# Altium schematic symbol library jlcpcb_2025_04_inductors_extended_0402.schlib: 1396 symbols (part 4 of 8)
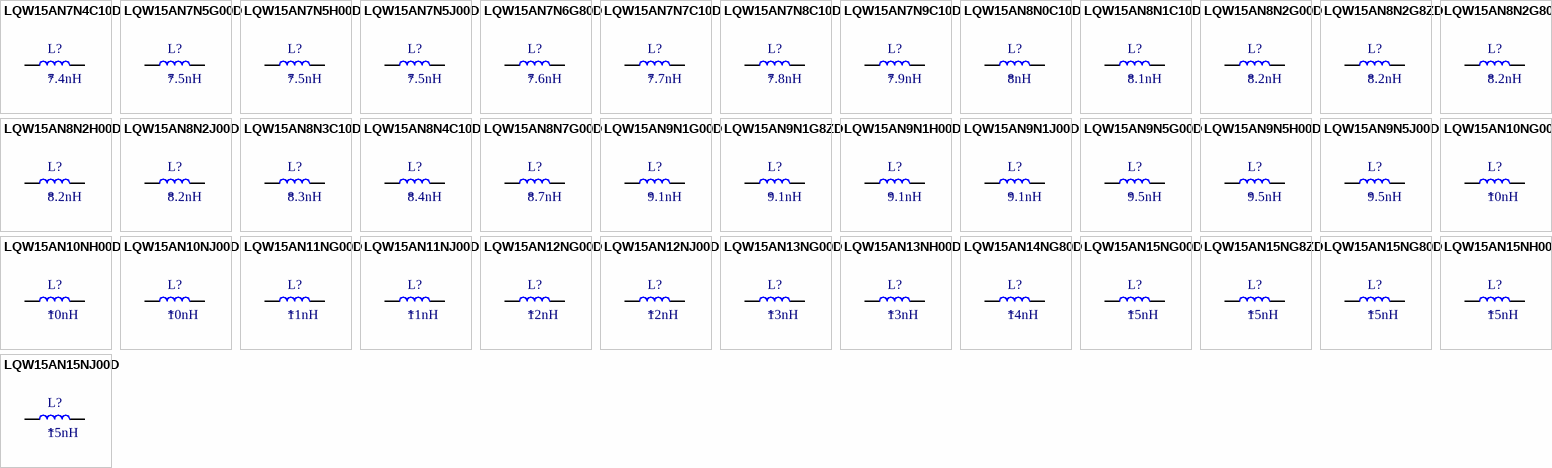
[diagram p37: symbols LQW15AN7N4C10D to LQW15AN15NJ00D]

## LQW15AN7N4C10D
designator L?  Inductance: 7.4nH
Inductor, 7.4nH, 58mΩ, SMD 0402; Manufacturer: Murata Electronics; Manufacturer Part Number: LQW15AN7N4C10D; Self-Resonant Frequency: 6.8GHz; Q Factor: 30@250MHz; Package Size: 0402; JLCPCB Basic Part: No; JLCPCB Part Number: C412356; Supplier 1: LCSC; Category: Inductors; Supplier Part Number 1: C412356; DC Resistance: 58mΩ; RoHS: Yes; ComponentLink1Description: Datasheet; ComponentLink1URL: https://wmsc.lcsc.com/wmsc/upload/file/pdf/v2/lcsc/2304140030_Murata-Electronics-LQW15AN7N4C10D_C412356.pdf; ComponentLink2Description: JLCPCB Part URL; ComponentLink2URL: https://jlcpcb.com/partdetail/C412356; ComponentLink3Description: LCSC Part URL; ComponentLink3URL: https://lcsc.com/product-detail/Inductors-SMD_Murata-Electronics-Murata-Electronics-LQW15AN7N4C10D_C412356.html
footprint IND-0402 (0402 (1005M) Inductor)
pins: 1, 2

## LQW15AN7N5G00D
designator L?  Inductance: 7.5nH
Inductor, 7.5nH, ±2%, 130mΩ, 570mA, SMD 0402; Manufacturer: Murata Electronics; Manufacturer Part Number: LQW15AN7N5G00D; Self-Resonant Frequency: 6GHz; Q Factor: 25@250MHz; Package Size: 0402; JLCPCB Basic Part: No; JLCPCB Part Number: C82918; Supplier 1: LCSC; Category: Inductors; Supplier Part Number 1: C82918; Tolerance: ±2%; Rated Current: 570mA; DC Resistance: 130mΩ; RoHS: Yes; ComponentLink1Description: Datasheet; ComponentLink1URL: https://wmsc.lcsc.com/wmsc/upload/file/pdf/v2/lcsc/1811081612_Murata-Electronics-LQW15AN7N5G00D_C82918.pdf; ComponentLink2Description: JLCPCB Part URL; ComponentLink2URL: https://jlcpcb.com/partdetail/C82918; ComponentLink3Description: LCSC Part URL; ComponentLink3URL: https://lcsc.com/product-detail/Inductors-SMD_Murata-Electronics-Murata-Electronics-LQW15AN7N5G00D_C82918.html
footprint IND-0402 (0402 (1005M) Inductor)
pins: 1, 2

## LQW15AN7N5H00D
designator L?  Inductance: 7.5nH
Inductor, 7.5nH, ±3%, 130mΩ, 570mA, SMD 0402; Manufacturer: Murata Electronics; Manufacturer Part Number: LQW15AN7N5H00D; Self-Resonant Frequency: 6GHz; Q Factor: 25@250MHz; Package Size: 0402; JLCPCB Basic Part: No; JLCPCB Part Number: C397303; Supplier 1: LCSC; Category: Inductors; Supplier Part Number 1: C397303; Tolerance: ±3%; Rated Current: 570mA; DC Resistance: 130mΩ; RoHS: Yes; ComponentLink1Description: Datasheet; ComponentLink1URL: https://wmsc.lcsc.com/wmsc/upload/file/pdf/v2/lcsc/2304140030_Murata-Electronics-LQW15AN7N5H00D_C397303.pdf; ComponentLink2Description: JLCPCB Part URL; ComponentLink2URL: https://jlcpcb.com/partdetail/C397303; ComponentLink3Description: LCSC Part URL; ComponentLink3URL: https://lcsc.com/product-detail/Inductors-SMD_Murata-Electronics-Murata-Electronics-LQW15AN7N5H00D_C397303.html
footprint IND-0402 (0402 (1005M) Inductor)
pins: 1, 2

## LQW15AN7N5J00D
designator L?  Inductance: 7.5nH
Inductor, 7.5nH, ±5%, 130mΩ, 570mA, SMD 0402; Manufacturer: Murata Electronics; Manufacturer Part Number: LQW15AN7N5J00D; Self-Resonant Frequency: 6GHz; Q Factor: 25@250MHz; Package Size: 0402; JLCPCB Basic Part: No; JLCPCB Part Number: C113120; Supplier 1: LCSC; Category: Inductors; Supplier Part Number 1: C113120; Tolerance: ±5%; Rated Current: 570mA; DC Resistance: 130mΩ; RoHS: Yes; ComponentLink1Description: Datasheet; ComponentLink1URL: https://wmsc.lcsc.com/wmsc/upload/file/pdf/v2/lcsc/2304140030_Murata-Electronics-LQW15AN7N5J00D_C113120.pdf; ComponentLink2Description: JLCPCB Part URL; ComponentLink2URL: https://jlcpcb.com/partdetail/C113120; ComponentLink3Description: LCSC Part URL; ComponentLink3URL: https://lcsc.com/product-detail/Inductors-SMD_Murata-Electronics-Murata-Electronics-LQW15AN7N5J00D_C113120.html
footprint IND-0402 (0402 (1005M) Inductor)
pins: 1, 2

## LQW15AN7N6G80D
designator L?  Inductance: 7.6nH
Inductor, 7.6nH, ±2%, 50mΩ, 1.7A, SMD 0402; Manufacturer: Murata Electronics; Manufacturer Part Number: LQW15AN7N6G80D; Package Size: 0402; JLCPCB Basic Part: No; JLCPCB Part Number: C2048575; Supplier 1: LCSC; Category: Inductors; Supplier Part Number 1: C2048575; Tolerance: ±2%; Rated Current: 1.7A; DC Resistance: 50mΩ; RoHS: Yes; ComponentLink1Description: Datasheet; ComponentLink1URL: https://wmsc.lcsc.com/wmsc/upload/file/pdf/v2/lcsc/2304140030_Murata-Electronics-LQW15AN7N6G80D_C2048575.pdf; ComponentLink2Description: JLCPCB Part URL; ComponentLink2URL: https://jlcpcb.com/partdetail/C2048575; ComponentLink3Description: LCSC Part URL; ComponentLink3URL: https://lcsc.com/product-detail/Power-Inductors_Murata-Electronics-Murata-Electronics-LQW15AN7N6G80D_C2048575.html
footprint IND-0402 (0402 (1005M) Inductor)
pins: 1, 2

## LQW15AN7N7C10D
designator L?  Inductance: 7.7nH
Inductor, 7.7nH, 58mΩ, SMD 0402; Manufacturer: Murata Electronics; Manufacturer Part Number: LQW15AN7N7C10D; Self-Resonant Frequency: 6.8GHz; Q Factor: 30@250MHz; Package Size: 0402; JLCPCB Basic Part: No; JLCPCB Part Number: C412358; Supplier 1: LCSC; Category: Inductors; Supplier Part Number 1: C412358; DC Resistance: 58mΩ; RoHS: Yes; ComponentLink1Description: Datasheet; ComponentLink1URL: https://wmsc.lcsc.com/wmsc/upload/file/pdf/v2/lcsc/2304140030_Murata-Electronics-LQW15AN7N7C10D_C412358.pdf; ComponentLink2Description: JLCPCB Part URL; ComponentLink2URL: https://jlcpcb.com/partdetail/C412358; ComponentLink3Description: LCSC Part URL; ComponentLink3URL: https://lcsc.com/product-detail/Inductors-SMD_Murata-Electronics-Murata-Electronics-LQW15AN7N7C10D_C412358.html
footprint IND-0402 (0402 (1005M) Inductor)
pins: 1, 2

## LQW15AN7N8C10D
designator L?  Inductance: 7.8nH
Inductor, 7.8nH, 58mΩ, SMD 0402; Manufacturer: Murata Electronics; Manufacturer Part Number: LQW15AN7N8C10D; Self-Resonant Frequency: 6.8GHz; Q Factor: 30@250MHz; Package Size: 0402; JLCPCB Basic Part: No; JLCPCB Part Number: C412359; Supplier 1: LCSC; Category: Inductors; Supplier Part Number 1: C412359; DC Resistance: 58mΩ; RoHS: Yes; ComponentLink1Description: Datasheet; ComponentLink1URL: https://wmsc.lcsc.com/wmsc/upload/file/pdf/v2/lcsc/2304140030_Murata-Electronics-LQW15AN7N8C10D_C412359.pdf; ComponentLink2Description: JLCPCB Part URL; ComponentLink2URL: https://jlcpcb.com/partdetail/C412359; ComponentLink3Description: LCSC Part URL; ComponentLink3URL: https://lcsc.com/product-detail/Inductors-SMD_Murata-Electronics-Murata-Electronics-LQW15AN7N8C10D_C412359.html
footprint IND-0402 (0402 (1005M) Inductor)
pins: 1, 2

## LQW15AN7N9C10D
designator L?  Inductance: 7.9nH
Inductor, 7.9nH, 79mΩ, SMD 0402; Manufacturer: Murata Electronics; Manufacturer Part Number: LQW15AN7N9C10D; Self-Resonant Frequency: 7.5GHz; Q Factor: 30@250MHz; Package Size: 0402; JLCPCB Basic Part: No; JLCPCB Part Number: C412360; Supplier 1: LCSC; Category: Inductors; Supplier Part Number 1: C412360; DC Resistance: 79mΩ; RoHS: Yes; ComponentLink1Description: Datasheet; ComponentLink1URL: https://wmsc.lcsc.com/wmsc/upload/file/pdf/v2/lcsc/2304140030_Murata-Electronics-LQW15AN7N9C10D_C412360.pdf; ComponentLink2Description: JLCPCB Part URL; ComponentLink2URL: https://jlcpcb.com/partdetail/C412360; ComponentLink3Description: LCSC Part URL; ComponentLink3URL: https://lcsc.com/product-detail/Inductors-SMD_Murata-Electronics-Murata-Electronics-LQW15AN7N9C10D_C412360.html
footprint IND-0402 (0402 (1005M) Inductor)
pins: 1, 2

## LQW15AN8N0C10D
designator L?  Inductance: 8nH
Inductor, 8nH, 79mΩ, SMD 0402; Manufacturer: Murata Electronics; Manufacturer Part Number: LQW15AN8N0C10D; Self-Resonant Frequency: 7.5GHz; Q Factor: 30@250MHz; Package Size: 0402; JLCPCB Basic Part: No; JLCPCB Part Number: C412361; Supplier 1: LCSC; Category: Inductors; Supplier Part Number 1: C412361; DC Resistance: 79mΩ; RoHS: Yes; ComponentLink1Description: Datasheet; ComponentLink1URL: https://wmsc.lcsc.com/wmsc/upload/file/pdf/v2/lcsc/2304140030_Murata-Electronics-LQW15AN8N0C10D_C412361.pdf; ComponentLink2Description: JLCPCB Part URL; ComponentLink2URL: https://jlcpcb.com/partdetail/C412361; ComponentLink3Description: LCSC Part URL; ComponentLink3URL: https://lcsc.com/product-detail/Inductors-SMD_Murata-Electronics-Murata-Electronics-LQW15AN8N0C10D_C412361.html
footprint IND-0402 (0402 (1005M) Inductor)
pins: 1, 2

## LQW15AN8N1C10D
designator L?  Inductance: 8.1nH
Inductor, 8.1nH, 79mΩ, SMD 0402; Manufacturer: Murata Electronics; Manufacturer Part Number: LQW15AN8N1C10D; Self-Resonant Frequency: 7.5GHz; Q Factor: 30@250MHz; Package Size: 0402; JLCPCB Basic Part: No; JLCPCB Part Number: C412362; Supplier 1: LCSC; Category: Inductors; Supplier Part Number 1: C412362; DC Resistance: 79mΩ; RoHS: Yes; ComponentLink1Description: Datasheet; ComponentLink1URL: https://wmsc.lcsc.com/wmsc/upload/file/pdf/v2/lcsc/2304140030_Murata-Electronics-LQW15AN8N1C10D_C412362.pdf; ComponentLink2Description: JLCPCB Part URL; ComponentLink2URL: https://jlcpcb.com/partdetail/C412362; ComponentLink3Description: LCSC Part URL; ComponentLink3URL: https://lcsc.com/product-detail/Inductors-SMD_Murata-Electronics-Murata-Electronics-LQW15AN8N1C10D_C412362.html
footprint IND-0402 (0402 (1005M) Inductor)
pins: 1, 2

## LQW15AN8N2G00D
designator L?  Inductance: 8.2nH
Inductor, 8.2nH, ±2%, 140mΩ, SMD 0402; Manufacturer: Murata Electronics; Manufacturer Part Number: LQW15AN8N2G00D; Self-Resonant Frequency: 5.5GHz; Q Factor: 25@250MHz; Package Size: 0402; JLCPCB Basic Part: No; JLCPCB Part Number: C84404; Supplier 1: LCSC; Category: Inductors; Supplier Part Number 1: C84404; Tolerance: ±2%; DC Resistance: 140mΩ; RoHS: Yes; ComponentLink1Description: Datasheet; ComponentLink1URL: https://wmsc.lcsc.com/wmsc/upload/file/pdf/v2/lcsc/1811081516_Murata-Electronics-LQW15AN8N2G00D_C84404.pdf; ComponentLink2Description: JLCPCB Part URL; ComponentLink2URL: https://jlcpcb.com/partdetail/C84404; ComponentLink3Description: LCSC Part URL; ComponentLink3URL: https://lcsc.com/product-detail/Inductors-SMD_Murata-Electronics-Murata-Electronics-LQW15AN8N2G00D_C84404.html
footprint IND-0402 (0402 (1005M) Inductor)
pins: 1, 2

## LQW15AN8N2G8ZD
designator L?  Inductance: 8.2nH
Inductor, 8.2nH, ±2%, 69mΩ, 1.5A, SMD 0402; Manufacturer: Murata Electronics; Manufacturer Part Number: LQW15AN8N2G8ZD; Self-Resonant Frequency: 6.5GHz; Q Factor: 32@250MHz; Package Size: 0402; JLCPCB Basic Part: No; JLCPCB Part Number: C1330582; Supplier 1: LCSC; Category: Inductors; Supplier Part Number 1: C1330582; Tolerance: ±2%; Rated Current: 1.5A; DC Resistance: 69mΩ; RoHS: Yes; ComponentLink1Description: Datasheet; ComponentLink1URL: https://wmsc.lcsc.com/wmsc/upload/file/pdf/v2/lcsc/2304140030_Murata-Electronics-LQW15AN8N2G8ZD_C1330582.pdf; ComponentLink2Description: JLCPCB Part URL; ComponentLink2URL: https://jlcpcb.com/partdetail/C1330582; ComponentLink3Description: LCSC Part URL; ComponentLink3URL: https://lcsc.com/product-detail/Inductors-SMD_Murata-Electronics-Murata-Electronics-LQW15AN8N2G8ZD_C1330582.html
footprint IND-0402 (0402 (1005M) Inductor)
pins: 1, 2

## LQW15AN8N2G80D
designator L?  Inductance: 8.2nH
Inductor, 8.2nH, ±2%, 69mΩ, 1.5A, SMD 0402; Manufacturer: Murata Electronics; Manufacturer Part Number: LQW15AN8N2G80D; Self-Resonant Frequency: 6.5GHz; Q Factor: 32@250MHz; Package Size: 0402; JLCPCB Basic Part: No; JLCPCB Part Number: C307610; Supplier 1: LCSC; Category: Inductors; Supplier Part Number 1: C307610; Tolerance: ±2%; Rated Current: 1.5A; DC Resistance: 69mΩ; RoHS: Yes; ComponentLink1Description: Datasheet; ComponentLink1URL: https://wmsc.lcsc.com/wmsc/upload/file/pdf/v2/lcsc/2304140030_Murata-Electronics-LQW15AN8N2G80D_C307610.pdf; ComponentLink2Description: JLCPCB Part URL; ComponentLink2URL: https://jlcpcb.com/partdetail/C307610; ComponentLink3Description: LCSC Part URL; ComponentLink3URL: https://lcsc.com/product-detail/Inductors-SMD_Murata-Electronics-Murata-Electronics-LQW15AN8N2G80D_C307610.html
footprint IND-0402 (0402 (1005M) Inductor)
pins: 1, 2

## LQW15AN8N2H00D
designator L?  Inductance: 8.2nH
Inductor, 8.2nH, ±3%, 140mΩ, 540mA, SMD 0402; Manufacturer: Murata Electronics; Manufacturer Part Number: LQW15AN8N2H00D; Self-Resonant Frequency: 5.5GHz; Q Factor: 25@250MHz; Package Size: 0402; JLCPCB Basic Part: No; JLCPCB Part Number: C341788; Supplier 1: LCSC; Category: Inductors; Supplier Part Number 1: C341788; Tolerance: ±3%; Rated Current: 540mA; DC Resistance: 140mΩ; RoHS: Yes; ComponentLink1Description: Datasheet; ComponentLink1URL: https://wmsc.lcsc.com/wmsc/upload/file/pdf/v2/lcsc/2304140030_Murata-Electronics-LQW15AN8N2H00D_C341788.pdf; ComponentLink2Description: JLCPCB Part URL; ComponentLink2URL: https://jlcpcb.com/partdetail/C341788; ComponentLink3Description: LCSC Part URL; ComponentLink3URL: https://lcsc.com/product-detail/Inductors-SMD_Murata-Electronics-Murata-Electronics-LQW15AN8N2H00D_C341788.html
footprint IND-0402 (0402 (1005M) Inductor)
pins: 1, 2

## LQW15AN8N2J00D
designator L?  Inductance: 8.2nH
Inductor, 8.2nH, ±5%, 140mΩ, 540mA, SMD 0402; Manufacturer: Murata Electronics; Manufacturer Part Number: LQW15AN8N2J00D; Self-Resonant Frequency: 5.5GHz; Q Factor: 25@250MHz; Package Size: 0402; JLCPCB Basic Part: No; JLCPCB Part Number: C98066; Supplier 1: LCSC; Category: Inductors; Supplier Part Number 1: C98066; Tolerance: ±5%; Rated Current: 540mA; DC Resistance: 140mΩ; RoHS: Yes; ComponentLink1Description: Datasheet; ComponentLink1URL: https://wmsc.lcsc.com/wmsc/upload/file/pdf/v2/lcsc/2304140030_Murata-Electronics-LQW15AN8N2J00D_C98066.pdf; ComponentLink2Description: JLCPCB Part URL; ComponentLink2URL: https://jlcpcb.com/partdetail/C98066; ComponentLink3Description: LCSC Part URL; ComponentLink3URL: https://lcsc.com/product-detail/Inductors-SMD_Murata-Electronics-Murata-Electronics-LQW15AN8N2J00D_C98066.html
footprint IND-0402 (0402 (1005M) Inductor)
pins: 1, 2

## LQW15AN8N3C10D
designator L?  Inductance: 8.3nH
Inductor, 8.3nH, 79mΩ, SMD 0402; Manufacturer: Murata Electronics; Manufacturer Part Number: LQW15AN8N3C10D; Self-Resonant Frequency: 7.5GHz; Q Factor: 30@250MHz; Package Size: 0402; JLCPCB Basic Part: No; JLCPCB Part Number: C412363; Supplier 1: LCSC; Category: Inductors; Supplier Part Number 1: C412363; DC Resistance: 79mΩ; RoHS: Yes; ComponentLink1Description: Datasheet; ComponentLink1URL: https://wmsc.lcsc.com/wmsc/upload/file/pdf/v2/lcsc/2304140030_Murata-Electronics-LQW15AN8N3C10D_C412363.pdf; ComponentLink2Description: JLCPCB Part URL; ComponentLink2URL: https://jlcpcb.com/partdetail/C412363; ComponentLink3Description: LCSC Part URL; ComponentLink3URL: https://lcsc.com/product-detail/Inductors-SMD_Murata-Electronics-Murata-Electronics-LQW15AN8N3C10D_C412363.html
footprint IND-0402 (0402 (1005M) Inductor)
pins: 1, 2

## LQW15AN8N4C10D
designator L?  Inductance: 8.4nH
Inductor, 8.4nH, 79mΩ, SMD 0402; Manufacturer: Murata Electronics; Manufacturer Part Number: LQW15AN8N4C10D; Self-Resonant Frequency: 7.5GHz; Q Factor: 30@250MHz; Package Size: 0402; JLCPCB Basic Part: No; JLCPCB Part Number: C412364; Supplier 1: LCSC; Category: Inductors; Supplier Part Number 1: C412364; DC Resistance: 79mΩ; RoHS: Yes; ComponentLink1Description: Datasheet; ComponentLink1URL: https://wmsc.lcsc.com/wmsc/upload/file/pdf/v2/lcsc/1912111437_Murata-Electronics-LQW15AN8N4C10D_C412364.pdf; ComponentLink2Description: JLCPCB Part URL; ComponentLink2URL: https://jlcpcb.com/partdetail/C412364; ComponentLink3Description: LCSC Part URL; ComponentLink3URL: https://lcsc.com/product-detail/Inductors-SMD_Murata-Electronics-Murata-Electronics-LQW15AN8N4C10D_C412364.html
footprint IND-0402 (0402 (1005M) Inductor)
pins: 1, 2

## LQW15AN8N7G00D
designator L?  Inductance: 8.7nH
Inductor, 8.7nH, ±2%, 140mΩ, 540mA, SMD 0402; Manufacturer: Murata Electronics; Manufacturer Part Number: LQW15AN8N7G00D; Self-Resonant Frequency: 5.5GHz; Q Factor: 25@250MHz; Package Size: 0402; JLCPCB Basic Part: No; JLCPCB Part Number: C269828; Supplier 1: LCSC; Category: Inductors; Supplier Part Number 1: C269828; Tolerance: ±2%; Rated Current: 540mA; DC Resistance: 140mΩ; RoHS: Yes; ComponentLink1Description: Datasheet; ComponentLink1URL: https://wmsc.lcsc.com/wmsc/upload/file/pdf/v2/lcsc/2304140030_Murata-Electronics-LQW15AN8N7G00D_C269828.pdf; ComponentLink2Description: JLCPCB Part URL; ComponentLink2URL: https://jlcpcb.com/partdetail/C269828; ComponentLink3Description: LCSC Part URL; ComponentLink3URL: https://lcsc.com/product-detail/Inductors-SMD_Murata-Electronics-Murata-Electronics-LQW15AN8N7G00D_C269828.html
footprint IND-0402 (0402 (1005M) Inductor)
pins: 1, 2

## LQW15AN9N1G00D
designator L?  Inductance: 9.1nH
Inductor, 9.1nH, ±2%, 140mΩ, 540mA, SMD 0402; Manufacturer: Murata Electronics; Manufacturer Part Number: LQW15AN9N1G00D; Self-Resonant Frequency: 5.5GHz; Q Factor: 25@250MHz; Package Size: 0402; JLCPCB Basic Part: No; JLCPCB Part Number: C113122; Supplier 1: LCSC; Category: Inductors; Supplier Part Number 1: C113122; Tolerance: ±2%; Rated Current: 540mA; DC Resistance: 140mΩ; RoHS: Yes; ComponentLink1Description: Datasheet; ComponentLink1URL: https://wmsc.lcsc.com/wmsc/upload/file/pdf/v2/lcsc/2304140030_Murata-Electronics-LQW15AN9N1G00D_C113122.pdf; ComponentLink2Description: JLCPCB Part URL; ComponentLink2URL: https://jlcpcb.com/partdetail/C113122; ComponentLink3Description: LCSC Part URL; ComponentLink3URL: https://lcsc.com/product-detail/Inductors-SMD_Murata-Electronics-Murata-Electronics-LQW15AN9N1G00D_C113122.html
footprint IND-0402 (0402 (1005M) Inductor)
pins: 1, 2

## LQW15AN9N1G8ZD
designator L?  Inductance: 9.1nH
Inductor, 9.1nH, ±2%, 80mΩ, 1.4A, SMD 0402; Manufacturer: Murata Electronics; Manufacturer Part Number: LQW15AN9N1G8ZD; Self-Resonant Frequency: 6.5GHz; Q Factor: 32@250MHz; Package Size: 0402; JLCPCB Basic Part: No; JLCPCB Part Number: C1330593; Supplier 1: LCSC; Category: Inductors; Supplier Part Number 1: C1330593; Tolerance: ±2%; Rated Current: 1.4A; DC Resistance: 80mΩ; RoHS: Yes; ComponentLink1Description: Datasheet; ComponentLink1URL: https://wmsc.lcsc.com/wmsc/upload/file/pdf/v2/lcsc/2304140030_Murata-Electronics-LQW15AN9N1G8ZD_C1330593.pdf; ComponentLink2Description: JLCPCB Part URL; ComponentLink2URL: https://jlcpcb.com/partdetail/C1330593; ComponentLink3Description: LCSC Part URL; ComponentLink3URL: https://lcsc.com/product-detail/Inductors-SMD_Murata-Electronics-Murata-Electronics-LQW15AN9N1G8ZD_C1330593.html
footprint IND-0402 (0402 (1005M) Inductor)
pins: 1, 2

## LQW15AN9N1H00D
designator L?  Inductance: 9.1nH
Inductor, 9.1nH, ±3%, 140mΩ, 540mA, SMD 0402; Manufacturer: Murata Electronics; Manufacturer Part Number: LQW15AN9N1H00D; Package Size: 0402; JLCPCB Basic Part: No; JLCPCB Part Number: C337956; Supplier 1: LCSC; Category: Inductors; Supplier Part Number 1: C337956; Tolerance: ±3%; Rated Current: 540mA; DC Resistance: 140mΩ; RoHS: Yes; ComponentLink1Description: Datasheet; ComponentLink1URL: https://wmsc.lcsc.com/wmsc/upload/file/pdf/v2/lcsc/2304140030_Murata-Electronics-LQW15AN9N1H00D_C337956.pdf; ComponentLink2Description: JLCPCB Part URL; ComponentLink2URL: https://jlcpcb.com/partdetail/C337956; ComponentLink3Description: LCSC Part URL; ComponentLink3URL: https://lcsc.com/product-detail/Power-Inductors_Murata-Electronics-Murata-Electronics-LQW15AN9N1H00D_C337956.html
footprint IND-0402 (0402 (1005M) Inductor)
pins: 1, 2

## LQW15AN9N1J00D
designator L?  Inductance: 9.1nH
Inductor, 9.1nH, ±5%, 140mΩ, 540mA, SMD 0402; Manufacturer: Murata Electronics; Manufacturer Part Number: LQW15AN9N1J00D; Package Size: 0402; JLCPCB Basic Part: No; JLCPCB Part Number: C437364; Supplier 1: LCSC; Category: Inductors; Supplier Part Number 1: C437364; Tolerance: ±5%; Rated Current: 540mA; DC Resistance: 140mΩ; RoHS: Yes; ComponentLink1Description: Datasheet; ComponentLink1URL: https://wmsc.lcsc.com/wmsc/upload/file/pdf/v2/lcsc/2001071133_Murata-Electronics-LQW15AN9N1J00D_C437364.pdf; ComponentLink2Description: JLCPCB Part URL; ComponentLink2URL: https://jlcpcb.com/partdetail/C437364; ComponentLink3Description: LCSC Part URL; ComponentLink3URL: https://lcsc.com/product-detail/Power-Inductors_Murata-Electronics-Murata-Electronics-LQW15AN9N1J00D_C437364.html
footprint IND-0402 (0402 (1005M) Inductor)
pins: 1, 2

## LQW15AN9N5G00D
designator L?  Inductance: 9.5nH
Inductor, 9.5nH, ±2%, 140mΩ, 540mA, SMD 0402; Manufacturer: Murata Electronics; Manufacturer Part Number: LQW15AN9N5G00D; Self-Resonant Frequency: 5.5GHz; Q Factor: 25@250MHz; Package Size: 0402; JLCPCB Basic Part: No; JLCPCB Part Number: C167489; Supplier 1: LCSC; Category: Inductors; Supplier Part Number 1: C167489; Tolerance: ±2%; Rated Current: 540mA; DC Resistance: 140mΩ; RoHS: Yes; ComponentLink1Description: Datasheet; ComponentLink1URL: https://wmsc.lcsc.com/wmsc/upload/file/pdf/v2/lcsc/2304140030_Murata-Electronics-LQW15AN9N5G00D_C167489.pdf; ComponentLink2Description: JLCPCB Part URL; ComponentLink2URL: https://jlcpcb.com/partdetail/C167489; ComponentLink3Description: LCSC Part URL; ComponentLink3URL: https://lcsc.com/product-detail/Inductors-SMD_Murata-Electronics-Murata-Electronics-LQW15AN9N5G00D_C167489.html
footprint IND-0402 (0402 (1005M) Inductor)
pins: 1, 2

## LQW15AN9N5H00D
designator L?  Inductance: 9.5nH
Inductor, 9.5nH, ±3%, 140mΩ, SMD 0402; Manufacturer: Murata Electronics; Manufacturer Part Number: LQW15AN9N5H00D; Self-Resonant Frequency: 5.5GHz; Q Factor: 25@250MHz; Package Size: 0402; JLCPCB Basic Part: No; JLCPCB Part Number: C167490; Supplier 1: LCSC; Category: Inductors; Supplier Part Number 1: C167490; Tolerance: ±3%; DC Resistance: 140mΩ; RoHS: Yes; ComponentLink1Description: Datasheet; ComponentLink1URL: https://wmsc.lcsc.com/wmsc/upload/file/pdf/v2/lcsc/2304140030_Murata-Electronics-LQW15AN9N5H00D_C167490.pdf; ComponentLink2Description: JLCPCB Part URL; ComponentLink2URL: https://jlcpcb.com/partdetail/C167490; ComponentLink3Description: LCSC Part URL; ComponentLink3URL: https://lcsc.com/product-detail/Inductors-SMD_Murata-Electronics-Murata-Electronics-LQW15AN9N5H00D_C167490.html
footprint IND-0402 (0402 (1005M) Inductor)
pins: 1, 2

## LQW15AN9N5J00D
designator L?  Inductance: 9.5nH
Inductor, 9.5nH, ±5%, 140mΩ, SMD 0402; Manufacturer: Murata Electronics; Manufacturer Part Number: LQW15AN9N5J00D; Self-Resonant Frequency: 5.5GHz; Q Factor: 25@250MHz; Package Size: 0402; JLCPCB Basic Part: No; JLCPCB Part Number: C435420; Supplier 1: LCSC; Category: Inductors; Supplier Part Number 1: C435420; Tolerance: ±5%; DC Resistance: 140mΩ; RoHS: Yes; ComponentLink1Description: Datasheet; ComponentLink1URL: https://wmsc.lcsc.com/wmsc/upload/file/pdf/v2/lcsc/2304140030_Murata-Electronics-LQW15AN9N5J00D_C435420.pdf; ComponentLink2Description: JLCPCB Part URL; ComponentLink2URL: https://jlcpcb.com/partdetail/C435420; ComponentLink3Description: LCSC Part URL; ComponentLink3URL: https://lcsc.com/product-detail/Inductors-SMD_Murata-Electronics-Murata-Electronics-LQW15AN9N5J00D_C435420.html
footprint IND-0402 (0402 (1005M) Inductor)
pins: 1, 2

## LQW15AN10NG00D
designator L?  Inductance: 10nH
Inductor, 10nH, ±2%, 170mΩ, 500mA, SMD 0402; Manufacturer: Murata Electronics; Manufacturer Part Number: LQW15AN10NG00D; Self-Resonant Frequency: 100MHz; Q Factor: 25@250MHz; Package Size: 0402; JLCPCB Basic Part: No; JLCPCB Part Number: C90642; Supplier 1: LCSC; Category: Inductors; Supplier Part Number 1: C90642; Tolerance: ±2%; Rated Current: 500mA; DC Resistance: 170mΩ; RoHS: Yes; ComponentLink1Description: Datasheet; ComponentLink1URL: https://wmsc.lcsc.com/wmsc/upload/file/pdf/v2/lcsc/1811081616_Murata-Electronics-LQW15AN10NG00D_C90642.pdf; ComponentLink2Description: JLCPCB Part URL; ComponentLink2URL: https://jlcpcb.com/partdetail/C90642; ComponentLink3Description: LCSC Part URL; ComponentLink3URL: https://lcsc.com/product-detail/Inductors-SMD_Murata-Electronics-Murata-Electronics-LQW15AN10NG00D_C90642.html
footprint IND-0402 (0402 (1005M) Inductor)
pins: 1, 2

## LQW15AN10NH00D
designator L?  Inductance: 10nH
Inductor, 10nH, ±3%, 170mΩ, 500mA, SMD 0402; Manufacturer: Murata Electronics; Manufacturer Part Number: LQW15AN10NH00D; Self-Resonant Frequency: 5.5GHz; Q Factor: 25@250MHz; Package Size: 0402; JLCPCB Basic Part: No; JLCPCB Part Number: C341683; Supplier 1: LCSC; Category: Inductors; Supplier Part Number 1: C341683; Tolerance: ±3%; Rated Current: 500mA; DC Resistance: 170mΩ; RoHS: Yes; ComponentLink1Description: Datasheet; ComponentLink1URL: https://wmsc.lcsc.com/wmsc/upload/file/pdf/v2/lcsc/2304140030_Murata-Electronics-LQW15AN10NH00D_C341683.pdf; ComponentLink2Description: JLCPCB Part URL; ComponentLink2URL: https://jlcpcb.com/partdetail/C341683; ComponentLink3Description: LCSC Part URL; ComponentLink3URL: https://lcsc.com/product-detail/Inductors-SMD_Murata-Electronics-Murata-Electronics-LQW15AN10NH00D_C341683.html
footprint IND-0402 (0402 (1005M) Inductor)
pins: 1, 2

## LQW15AN10NJ00D
designator L?  Inductance: 10nH
Inductor, 10nH, ±5%, 170mΩ, SMD 0402; Manufacturer: Murata Electronics; Manufacturer Part Number: LQW15AN10NJ00D; Self-Resonant Frequency: 5.5GHz; Q Factor: 25@250MHz; Package Size: 0402; JLCPCB Basic Part: No; JLCPCB Part Number: C184029; Supplier 1: LCSC; Category: Inductors; Supplier Part Number 1: C184029; Tolerance: ±5%; DC Resistance: 170mΩ; RoHS: Yes; ComponentLink1Description: Datasheet; ComponentLink1URL: https://wmsc.lcsc.com/wmsc/upload/file/pdf/v2/lcsc/2304140030_Murata-Electronics-LQW15AN10NJ00D_C184029.pdf; ComponentLink2Description: JLCPCB Part URL; ComponentLink2URL: https://jlcpcb.com/partdetail/C184029; ComponentLink3Description: LCSC Part URL; ComponentLink3URL: https://lcsc.com/product-detail/Inductors-SMD_Murata-Electronics-Murata-Electronics-LQW15AN10NJ00D_C184029.html
footprint IND-0402 (0402 (1005M) Inductor)
pins: 1, 2

## LQW15AN11NG00D
designator L?  Inductance: 11nH
Inductor, 11nH, ±2%, 140mΩ, 500mA, SMD 0402; Manufacturer: Murata Electronics; Manufacturer Part Number: LQW15AN11NG00D; Self-Resonant Frequency: 5.5GHz; Q Factor: 30@250MHz; Package Size: 0402; JLCPCB Basic Part: No; JLCPCB Part Number: C113109; Supplier 1: LCSC; Category: Inductors; Supplier Part Number 1: C113109; Tolerance: ±2%; Rated Current: 500mA; DC Resistance: 140mΩ; RoHS: Yes; ComponentLink1Description: Datasheet; ComponentLink1URL: https://wmsc.lcsc.com/wmsc/upload/file/pdf/v2/lcsc/2304140030_Murata-Electronics-LQW15AN11NG00D_C113109.pdf; ComponentLink2Description: JLCPCB Part URL; ComponentLink2URL: https://jlcpcb.com/partdetail/C113109; ComponentLink3Description: LCSC Part URL; ComponentLink3URL: https://lcsc.com/product-detail/Inductors-SMD_Murata-Electronics-Murata-Electronics-LQW15AN11NG00D_C113109.html
footprint IND-0402 (0402 (1005M) Inductor)
pins: 1, 2

## LQW15AN11NJ00D
designator L?  Inductance: 11nH
Inductor, 11nH, ±5%, 140mΩ, 500mA, SMD 0402; Manufacturer: Murata Electronics; Manufacturer Part Number: LQW15AN11NJ00D; Self-Resonant Frequency: 5.5GHz; Q Factor: 30@250MHz; Package Size: 0402; JLCPCB Basic Part: No; JLCPCB Part Number: C167465; Supplier 1: LCSC; Category: Inductors; Supplier Part Number 1: C167465; Tolerance: ±5%; Rated Current: 500mA; DC Resistance: 140mΩ; RoHS: Yes; ComponentLink1Description: Datasheet; ComponentLink1URL: https://wmsc.lcsc.com/wmsc/upload/file/pdf/v2/lcsc/2304140030_Murata-Electronics-LQW15AN11NJ00D_C167465.pdf; ComponentLink2Description: JLCPCB Part URL; ComponentLink2URL: https://jlcpcb.com/partdetail/C167465; ComponentLink3Description: LCSC Part URL; ComponentLink3URL: https://lcsc.com/product-detail/Inductors-SMD_Murata-Electronics-Murata-Electronics-LQW15AN11NJ00D_C167465.html
footprint IND-0402 (0402 (1005M) Inductor)
pins: 1, 2

## LQW15AN12NG00D
designator L?  Inductance: 12nH
Inductor, 12nH, ±2%, 140mΩ, 500mA, SMD 0402; Manufacturer: Murata Electronics; Manufacturer Part Number: LQW15AN12NG00D; Self-Resonant Frequency: 5.5GHz; Q Factor: 30@250MHz; Package Size: 0402; JLCPCB Basic Part: No; JLCPCB Part Number: C86128; Supplier 1: LCSC; Category: Inductors; Supplier Part Number 1: C86128; Tolerance: ±2%; Rated Current: 500mA; DC Resistance: 140mΩ; RoHS: Yes; ComponentLink1Description: Datasheet; ComponentLink1URL: https://wmsc.lcsc.com/wmsc/upload/file/pdf/v2/lcsc/1811081614_Murata-Electronics-LQW15AN12NG00D_C86128.pdf; ComponentLink2Description: JLCPCB Part URL; ComponentLink2URL: https://jlcpcb.com/partdetail/C86128; ComponentLink3Description: LCSC Part URL; ComponentLink3URL: https://lcsc.com/product-detail/Inductors-SMD_Murata-Electronics-Murata-Electronics-LQW15AN12NG00D_C86128.html
footprint IND-0402 (0402 (1005M) Inductor)
pins: 1, 2

## LQW15AN12NJ00D
designator L?  Inductance: 12nH
Inductor, 12nH, ±5%, 140mΩ, SMD 0402; Manufacturer: Murata Electronics; Manufacturer Part Number: LQW15AN12NJ00D; Self-Resonant Frequency: 5.5GHz; Q Factor: 30@250MHz; Package Size: 0402; JLCPCB Basic Part: No; JLCPCB Part Number: C82920; Supplier 1: LCSC; Category: Inductors; Supplier Part Number 1: C82920; Tolerance: ±5%; DC Resistance: 140mΩ; RoHS: Yes; ComponentLink1Description: Datasheet; ComponentLink1URL: https://wmsc.lcsc.com/wmsc/upload/file/pdf/v2/lcsc/1811081617_Murata-Electronics-LQW15AN12NJ00D_C82920.pdf; ComponentLink2Description: JLCPCB Part URL; ComponentLink2URL: https://jlcpcb.com/partdetail/C82920; ComponentLink3Description: LCSC Part URL; ComponentLink3URL: https://lcsc.com/product-detail/Inductors-SMD_Murata-Electronics-Murata-Electronics-LQW15AN12NJ00D_C82920.html
footprint IND-0402 (0402 (1005M) Inductor)
pins: 1, 2

## LQW15AN13NG00D
designator L?  Inductance: 13nH
Inductor, 13nH, ±2%, 210mΩ, 430mA, SMD 0402; Manufacturer: Murata Electronics; Manufacturer Part Number: LQW15AN13NG00D; Self-Resonant Frequency: 5GHz; Q Factor: 25@250MHz; Package Size: 0402; JLCPCB Basic Part: No; JLCPCB Part Number: C341684; Supplier 1: LCSC; Category: Inductors; Supplier Part Number 1: C341684; Tolerance: ±2%; Rated Current: 430mA; DC Resistance: 210mΩ; RoHS: Yes; ComponentLink1Description: Datasheet; ComponentLink1URL: https://wmsc.lcsc.com/wmsc/upload/file/pdf/v2/lcsc/2304140030_Murata-Electronics-LQW15AN13NG00D_C341684.pdf; ComponentLink2Description: JLCPCB Part URL; ComponentLink2URL: https://jlcpcb.com/partdetail/C341684; ComponentLink3Description: LCSC Part URL; ComponentLink3URL: https://lcsc.com/product-detail/Inductors-SMD_Murata-Electronics-Murata-Electronics-LQW15AN13NG00D_C341684.html
footprint IND-0402 (0402 (1005M) Inductor)
pins: 1, 2

## LQW15AN13NH00D
designator L?  Inductance: 13nH
Inductor, 13nH, ±3%, 210mΩ, 430mA, SMD 0402; Manufacturer: Murata Electronics; Manufacturer Part Number: LQW15AN13NH00D; Package Size: 0402; JLCPCB Basic Part: No; JLCPCB Part Number: C703124; Supplier 1: LCSC; Category: Inductors; Supplier Part Number 1: C703124; Tolerance: ±3%; Rated Current: 430mA; DC Resistance: 210mΩ; RoHS: Yes; ComponentLink1Description: Datasheet; ComponentLink1URL: https://wmsc.lcsc.com/wmsc/upload/file/pdf/v2/lcsc/2304140030_Murata-Electronics-LQW15AN13NH00D_C703124.pdf; ComponentLink2Description: JLCPCB Part URL; ComponentLink2URL: https://jlcpcb.com/partdetail/C703124; ComponentLink3Description: LCSC Part URL; ComponentLink3URL: https://lcsc.com/product-detail/Power-Inductors_Murata-Electronics-Murata-Electronics-LQW15AN13NH00D_C703124.html
footprint IND-0402 (0402 (1005M) Inductor)
pins: 1, 2

## LQW15AN14NG80D
designator L?  Inductance: 14nH
Inductor, 14nH, ±2%, 111mΩ, 1.15A, SMD 0402; Manufacturer: Murata Electronics; Manufacturer Part Number: LQW15AN14NG80D; Self-Resonant Frequency: 5.2GHz; Q Factor: 31@250MHz; Package Size: 0402; JLCPCB Basic Part: No; JLCPCB Part Number: C527596; Supplier 1: LCSC; Category: Inductors; Supplier Part Number 1: C527596; Tolerance: ±2%; Rated Current: 1.15A; DC Resistance: 111mΩ; RoHS: Yes; ComponentLink1Description: Datasheet; ComponentLink1URL: https://wmsc.lcsc.com/wmsc/upload/file/pdf/v2/lcsc/2007031831_Murata-Electronics-LQW15AN14NG80D_C527596.pdf; ComponentLink2Description: JLCPCB Part URL; ComponentLink2URL: https://jlcpcb.com/partdetail/C527596; ComponentLink3Description: LCSC Part URL; ComponentLink3URL: https://lcsc.com/product-detail/Inductors-SMD_Murata-Electronics-Murata-Electronics-LQW15AN14NG80D_C527596.html
footprint IND-0402 (0402 (1005M) Inductor)
pins: 1, 2

## LQW15AN15NG00D
designator L?  Inductance: 15nH
Inductor, 15nH, ±2%, 160mΩ, 460mA, SMD 0402; Manufacturer: Murata Electronics; Manufacturer Part Number: LQW15AN15NG00D; Self-Resonant Frequency: 5GHz; Q Factor: 30@250MHz; Package Size: 0402; JLCPCB Basic Part: No; JLCPCB Part Number: C98055; Supplier 1: LCSC; Category: Inductors; Supplier Part Number 1: C98055; Tolerance: ±2%; Rated Current: 460mA; DC Resistance: 160mΩ; RoHS: Yes; ComponentLink1Description: Datasheet; ComponentLink1URL: https://wmsc.lcsc.com/wmsc/upload/file/pdf/v2/lcsc/2304140030_Murata-Electronics-LQW15AN15NG00D_C98055.pdf; ComponentLink2Description: JLCPCB Part URL; ComponentLink2URL: https://jlcpcb.com/partdetail/C98055; ComponentLink3Description: LCSC Part URL; ComponentLink3URL: https://lcsc.com/product-detail/Inductors-SMD_Murata-Electronics-Murata-Electronics-LQW15AN15NG00D_C98055.html
footprint IND-0402 (0402 (1005M) Inductor)
pins: 1, 2

## LQW15AN15NG8ZD
designator L?  Inductance: 15nH
Inductor, 15nH, ±2%, 114mΩ, SMD 0402; Manufacturer: Murata Electronics; Manufacturer Part Number: LQW15AN15NG8ZD; Self-Resonant Frequency: 5.5GHz; Q Factor: 31@250MHz; Package Size: 0402; JLCPCB Basic Part: No; JLCPCB Part Number: C2044253; Supplier 1: LCSC; Category: Inductors; Supplier Part Number 1: C2044253; Tolerance: ±2%; DC Resistance: 114mΩ; RoHS: Yes; ComponentLink1Description: Datasheet; ComponentLink1URL: https://wmsc.lcsc.com/wmsc/upload/file/pdf/v2/lcsc/2304140030_Murata-Electronics-LQW15AN15NG8ZD_C2044253.pdf; ComponentLink2Description: JLCPCB Part URL; ComponentLink2URL: https://jlcpcb.com/partdetail/C2044253; ComponentLink3Description: LCSC Part URL; ComponentLink3URL: https://lcsc.com/product-detail/Inductors-SMD_Murata-Electronics-Murata-Electronics-LQW15AN15NG8ZD_C2044253.html
footprint IND-0402 (0402 (1005M) Inductor)
pins: 1, 2

## LQW15AN15NG80D
designator L?  Inductance: 15nH
Inductor, 15nH, ±2%, 114mΩ, 1.15A, SMD 0402; Manufacturer: Murata Electronics; Manufacturer Part Number: LQW15AN15NG80D; Package Size: 0402; JLCPCB Basic Part: No; JLCPCB Part Number: C668460; Supplier 1: LCSC; Category: Inductors; Supplier Part Number 1: C668460; Tolerance: ±2%; Rated Current: 1.15A; DC Resistance: 114mΩ; RoHS: Yes; ComponentLink1Description: Datasheet; ComponentLink1URL: https://wmsc.lcsc.com/wmsc/upload/file/pdf/v2/lcsc/2201051730_Murata-Electronics-LQW15AN15NG80D_C668460.pdf; ComponentLink2Description: JLCPCB Part URL; ComponentLink2URL: https://jlcpcb.com/partdetail/C668460; ComponentLink3Description: LCSC Part URL; ComponentLink3URL: https://lcsc.com/product-detail/Power-Inductors_Murata-Electronics-Murata-Electronics-LQW15AN15NG80D_C668460.html
footprint IND-0402 (0402 (1005M) Inductor)
pins: 1, 2

## LQW15AN15NH00D
designator L?  Inductance: 15nH
Inductor, 15nH, ±3%, 160mΩ, SMD 0402; Manufacturer: Murata Electronics; Manufacturer Part Number: LQW15AN15NH00D; Self-Resonant Frequency: 5GHz; Q Factor: 30@250MHz; Package Size: 0402; JLCPCB Basic Part: No; JLCPCB Part Number: C91621; Supplier 1: LCSC; Category: Inductors; Supplier Part Number 1: C91621; Tolerance: ±3%; DC Resistance: 160mΩ; RoHS: Yes; ComponentLink1Description: Datasheet; ComponentLink1URL: https://wmsc.lcsc.com/wmsc/upload/file/pdf/v2/lcsc/2302231008_Murata-Electronics-LQW15AN15NH00D_C91621.pdf; ComponentLink2Description: JLCPCB Part URL; ComponentLink2URL: https://jlcpcb.com/partdetail/C91621; ComponentLink3Description: LCSC Part URL; ComponentLink3URL: https://lcsc.com/product-detail/Inductors-SMD_Murata-Electronics-Murata-Electronics-LQW15AN15NH00D_C91621.html
footprint IND-0402 (0402 (1005M) Inductor)
pins: 1, 2

## LQW15AN15NJ00D
designator L?  Inductance: 15nH
Inductor, 15nH, ±5%, 160mΩ, 460mA, SMD 0402; Manufacturer: Murata Electronics; Manufacturer Part Number: LQW15AN15NJ00D; Self-Resonant Frequency: 5GHz; Q Factor: 30@250MHz; Package Size: 0402; JLCPCB Basic Part: No; JLCPCB Part Number: C94079; Supplier 1: LCSC; Category: Inductors; Supplier Part Number 1: C94079; Tolerance: ±5%; Rated Current: 460mA; DC Resistance: 160mΩ; RoHS: Yes; ComponentLink1Description: Datasheet; ComponentLink1URL: https://wmsc.lcsc.com/wmsc/upload/file/pdf/v2/lcsc/1811081515_Murata-Electronics-LQW15AN15NJ00D_C94079.pdf; ComponentLink2Description: JLCPCB Part URL; ComponentLink2URL: https://jlcpcb.com/partdetail/C94079; ComponentLink3Description: LCSC Part URL; ComponentLink3URL: https://lcsc.com/product-detail/Inductors-SMD_Murata-Electronics-Murata-Electronics-LQW15AN15NJ00D_C94079.html
footprint IND-0402 (0402 (1005M) Inductor)
pins: 1, 2

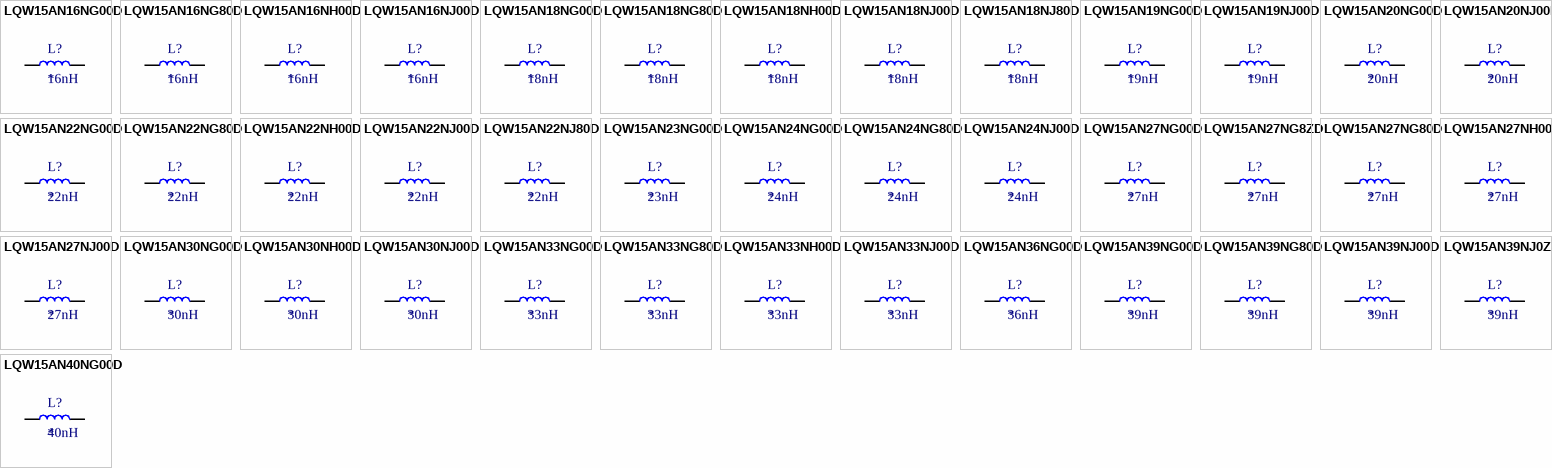
[diagram p15: symbols LQW15AN16NG00D to LQW15AN40NG00D]

## LQW15AN16NG00D
designator L?  Inductance: 16nH
Inductor, 16nH, ±2%, 240mΩ, 370mA, SMD 0402; Manufacturer: Murata Electronics; Manufacturer Part Number: LQW15AN16NG00D; Self-Resonant Frequency: 4.5GHz; Q Factor: 25@250MHz; Package Size: 0402; JLCPCB Basic Part: No; JLCPCB Part Number: C113110; Supplier 1: LCSC; Category: Inductors; Supplier Part Number 1: C113110; Tolerance: ±2%; Rated Current: 370mA; DC Resistance: 240mΩ; RoHS: Yes; ComponentLink1Description: Datasheet; ComponentLink1URL: https://wmsc.lcsc.com/wmsc/upload/file/pdf/v2/lcsc/2304140030_Murata-Electronics-LQW15AN16NG00D_C113110.pdf; ComponentLink2Description: JLCPCB Part URL; ComponentLink2URL: https://jlcpcb.com/partdetail/C113110; ComponentLink3Description: LCSC Part URL; ComponentLink3URL: https://lcsc.com/product-detail/Inductors-SMD_Murata-Electronics-Murata-Electronics-LQW15AN16NG00D_C113110.html
footprint IND-0402 (0402 (1005M) Inductor)
pins: 1, 2

## LQW15AN16NG80D
designator L?  Inductance: 16nH
Inductor, 16nH, ±2%, 126mΩ, 1A, SMD 0402; Manufacturer: Murata Electronics; Manufacturer Part Number: LQW15AN16NG80D; Package Size: 0402; JLCPCB Basic Part: No; JLCPCB Part Number: C882470; Supplier 1: LCSC; Category: Inductors; Supplier Part Number 1: C882470; Tolerance: ±2%; Rated Current: 1A; DC Resistance: 126mΩ; RoHS: Yes; ComponentLink1Description: Datasheet; ComponentLink1URL: https://wmsc.lcsc.com/wmsc/upload/file/pdf/v2/lcsc/2304140030_Murata-Electronics-LQW15AN16NG80D_C882470.pdf; ComponentLink2Description: JLCPCB Part URL; ComponentLink2URL: https://jlcpcb.com/partdetail/C882470; ComponentLink3Description: LCSC Part URL; ComponentLink3URL: https://lcsc.com/product-detail/Power-Inductors_Murata-Electronics-Murata-Electronics-LQW15AN16NG80D_C882470.html
footprint IND-0402 (0402 (1005M) Inductor)
pins: 1, 2

## LQW15AN16NH00D
designator L?  Inductance: 16nH
Inductor, 16nH, ±3%, 240mΩ, 370mA, SMD 0402; Manufacturer: Murata Electronics; Manufacturer Part Number: LQW15AN16NH00D; Self-Resonant Frequency: 4.5GHz; Q Factor: 25@250MHz; Package Size: 0402; JLCPCB Basic Part: No; JLCPCB Part Number: C167467; Supplier 1: LCSC; Category: Inductors; Supplier Part Number 1: C167467; Tolerance: ±3%; Rated Current: 370mA; DC Resistance: 240mΩ; RoHS: Yes; ComponentLink1Description: Datasheet; ComponentLink1URL: https://wmsc.lcsc.com/wmsc/upload/file/pdf/v2/lcsc/2304140030_Murata-Electronics-LQW15AN16NH00D_C167467.pdf; ComponentLink2Description: JLCPCB Part URL; ComponentLink2URL: https://jlcpcb.com/partdetail/C167467; ComponentLink3Description: LCSC Part URL; ComponentLink3URL: https://lcsc.com/product-detail/Inductors-SMD_Murata-Electronics-Murata-Electronics-LQW15AN16NH00D_C167467.html
footprint IND-0402 (0402 (1005M) Inductor)
pins: 1, 2

## LQW15AN16NJ00D
designator L?  Inductance: 16nH
Inductor, 16nH, ±5%, 240mΩ, 370mA, SMD 0402; Manufacturer: Murata Electronics; Manufacturer Part Number: LQW15AN16NJ00D; Package Size: 0402; JLCPCB Basic Part: No; JLCPCB Part Number: C237306; Supplier 1: LCSC; Category: Inductors; Supplier Part Number 1: C237306; Tolerance: ±5%; Rated Current: 370mA; DC Resistance: 240mΩ; RoHS: Yes; ComponentLink1Description: Datasheet; ComponentLink1URL: https://wmsc.lcsc.com/wmsc/upload/file/pdf/v2/lcsc/2308111548_Murata-Electronics-LQW15AN16NJ00D_C237306.pdf; ComponentLink2Description: JLCPCB Part URL; ComponentLink2URL: https://jlcpcb.com/partdetail/C237306; ComponentLink3Description: LCSC Part URL; ComponentLink3URL: https://lcsc.com/product-detail/Power-Inductors_Murata-Electronics-Murata-Electronics-LQW15AN16NJ00D_C237306.html
footprint IND-0402 (0402 (1005M) Inductor)
pins: 1, 2